# Altium footprint library Design III PCB Library.PcbLib: 98 footprints (part 4 of 7)
Each footprint in its own frame and in the unit in brackets; x right, y up, seen from the top. Pads: shape width x height; smd on the part's side, far side on the other; paste and mask are expansions set on the pad; w line width, h text height; cw(c..) or ccw(c..) is an arc to the next point about the centre after c.
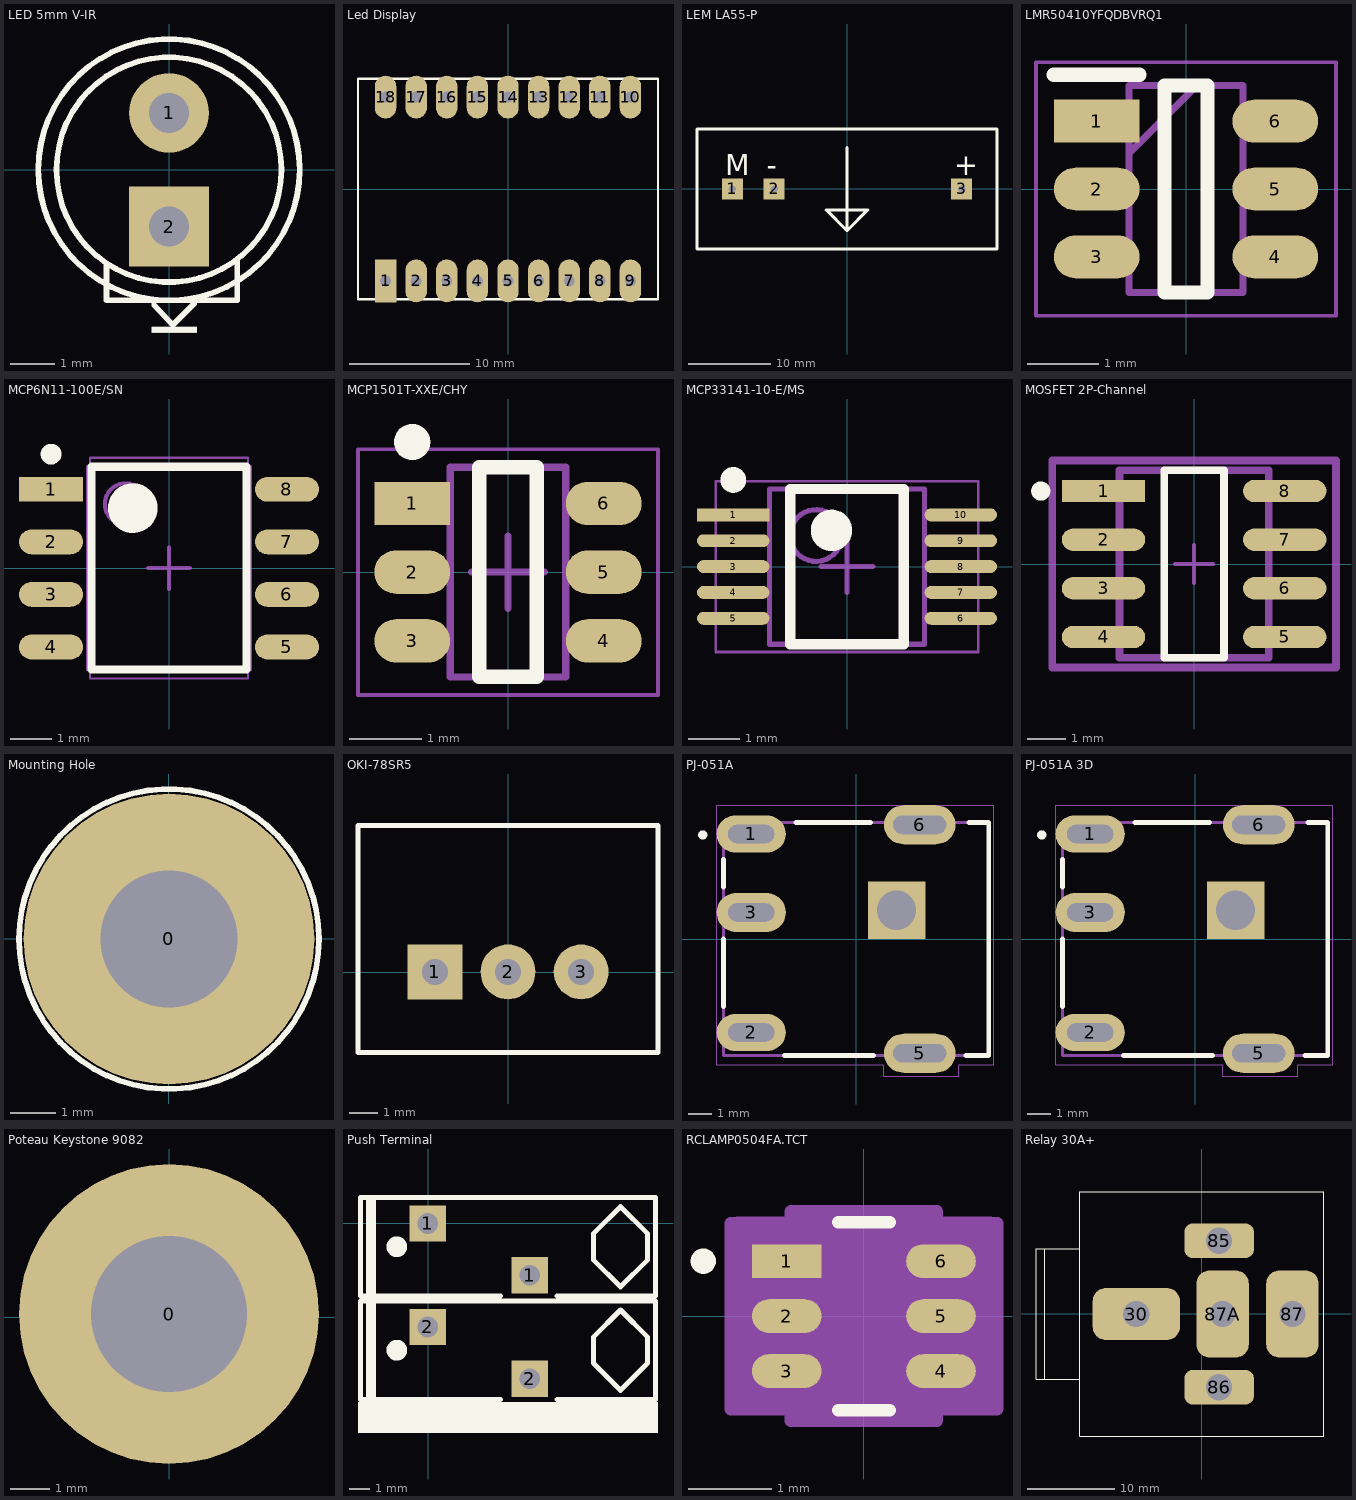
[diagram p3: the footprints below, top view; thin cyan lines are the x and y axes]

## LED 5mm V-IR [mil] "LED 5mm V-IR"
pads (2):
  round 70 hole 35.4: 1(-0.3,49.97)
  rect 70x70 hole 35.4: 2(-0.3,-50.03)
Top Overlay:
  circle w5: c-0.3,-0.03 r99
  circle w5: c-0.3,-0.03 r115
  lines w5: -55.3,-84.03 -55.3,-115.03 59.7,-115.03 59.7,-79.03
  text "K" at 24.7,-149.03 h40
3D body: height 20, standoff 10, extent -114.38,-114.79 114.71,114.76
3D body: height 20, standoff 10, extent -55.3,-115.03 59.7,-80.03
3D body: height 185, standoff 10, extent -104.47,-104.81 104.7,104.77
3D body: height 10, standoff -30, extent -15.18,35.01 14.7,64.95
3D body: height 10, standoff -30, extent -15.18,-64.99 14.7,-35.05
3D body: height 285, standoff 75, extent -104.2,-104.57 104.7,104.53

## Led Display [mil] "Led Display"
pads (18):
  rect 70x140 hole 35.4: 1(-400,-300)
  oval 70x140 hole 35.4: 2(-300,-300) 3(-200,-300) 4(-100,-300) 5(0,-300) 6(100,-300) 7(200,-300) 8(300,-300) 9(400,-300) 10(400,300) 11(300,300) 12(200,300) 13(100,300) 14(0,300) 15(-100,300) 16(-200,300) 17(-300,300) 18(-400,300)
Top Overlay:
  lines w7: -490,-360 -490,360 490,360 490,-360 -490,-360
3D body: height 45, standoff -25, extent 384.04,284.01 416,316
3D body: height 45, standoff -25, extent 384.04,-315.99 416.01,-284
3D body: height 45, standoff -25, extent -415.96,284.01 -384,315.99
3D body: height 45, standoff -25, extent -315.96,284.01 -284,316
3D body: height 45, standoff -25, extent -215.96,284.01 -184,316
3D body: height 45, standoff -25, extent -115.96,284.01 -84,316
3D body: height 45, standoff -25, extent -15.96,284.01 16,316
3D body: height 45, standoff -25, extent 84.04,284.02 116,316
3D body: height 45, standoff -25, extent 184.04,284.02 216,316
3D body: height 45, standoff -25, extent 284.04,284.02 316,316
3D body: height 45, standoff -25, extent 284.04,-315.98 316,-284
3D body: height 45, standoff -25, extent 184.04,-315.98 216,-284
3D body: height 45, standoff -25, extent 84.04,-315.98 116,-284
3D body: height 45, standoff -25, extent -15.96,-315.98 16,-284
3D body: height 45, standoff -25, extent -115.96,-315.98 -84,-284
3D body: height 45, standoff -25, extent -215.96,-315.98 -183.99,-284
3D body: height 45, standoff -25, extent -315.96,-315.98 -283.99,-284
3D body: height 45, standoff -25, extent -415.96,-315.99 -384,-284
3D body: height 318, standoff 315, extent 400.04,-259.98 460.01,-200
3D body: height 318, standoff 315, extent -79.96,-259.99 -20,-200.01
3D body: height 318, standoff 315, extent 139.5,-27 344.5,23
3D body: height 318, standoff 315, extent 55.82,-260.43 136.65,-3
3D body: height 318, standoff 315, extent 169,209 369,259
3D body: height 318, standoff 315, extent 114,-261 314,-211
3D body: height 318, standoff 315, extent 79.99,1 169.31,258.08
3D body: height 318, standoff 315, extent 313.69,-262.08 403.01,-5
3D body: height 318, standoff 315, extent 348.44,2.29 429.27,259.72
3D body: height 318, standoff 315, extent -130.56,3.29 -49.73,260.72
3D body: height 318, standoff 315, extent -165.31,-261.08 -75.99,-4
3D body: height 318, standoff 315, extent -399.01,2 -309.69,259.08
3D body: height 318, standoff 315, extent -365,-260 -165,-210
3D body: height 318, standoff 315, extent -310,210 -110,260
3D body: height 318, standoff 315, extent -340,-25 -135,25
3D body: height 51, standoff 45, extent -485,-355 485,355
3D body: height 315, standoff 50, extent -490,-360 490,360
3D body: height 50, standoff 0, extent 430,300 490,360
3D body: height 50, standoff 0, extent 430,-360 490,-300
3D body: height 50, standoff 0, extent -490,-360 -430,-300
3D body: height 50, standoff 0, extent -490,300 -430,360
3D body: height 317, standoff 315, extent -490,-360 490,360
3D body: height 318, standoff 315, extent -423.18,-259.43 -342.35,-2
3D body: height 45, standoff 42, extent 75,70 130,144.98
3D body: height 45, standoff 42, extent 15,70 65,140
3D body: height 45, standoff 42, extent -45,70 5,140
3D body: height 45, standoff 42, extent -85,70 -55,140
3D body: height 45, standoff 42, extent -155,70 -105,140

## LEM LA55-P [mm] "LEM LA55-P"
pads (3):
  rect 2.54x2.54 hole 0.899: 1(-13.998,-0.028) 2(-8.918,-0.028) 3(13.942,-0.028)
Top Overlay:
  lines w0.381: -0.028,5.052 -0.028,-5.108 ; -0.028,-5.108 2.512,-2.568 -2.568,-2.568 -0.028,-5.108 ; -18.316,-7.343 18.26,-7.343 18.26,7.288 -18.316,7.288 -18.316,-7.343
  text "M" at -14.887,1.623 h2.54
  text "-" at -9.807,1.623 h2.54
  text "+" at 13.053,1.623 h2.54
3D body: height 25.63, standoff 0.03, extent -18.315,-7.063 18.261,7.288

## LMR50410YFQDBVRQ1 [mm] "Buck Switching Regulator IC Positive Adjustable 1V 1 Output 1A SOT-23-6"
pads (6):
  rect 1.2x0.6 smd: 1(-1.25,0.95)
  oval 1.2x0.6 smd: 2(-1.25,0) 3(-1.25,-0.95) 4(1.25,-0.95) 5(1.25,0) 6(1.25,0.95)
Top Overlay:
  lines w0.2: -1.85,1.6 -0.65,1.6 ; -0.3,-1.45 0.3,-1.45 0.3,1.45 -0.3,1.45 -0.3,-1.45
Mechanical 13:
  lines w0.1: -0.8,0.5 0.15,1.45 ; -0.8,-1.45 0.8,-1.45 0.8,1.45 -0.8,1.45 -0.8,-1.45
Mechanical 15:
  lines w0.05: -2.1,-1.775 2.1,-1.775 2.1,1.775 -2.1,1.775 -2.1,-1.775
3D body "LMR50410YFQDBVRQ1.stp": height 1.45, standoff 0, extent -1.4,-1.45 1.4,1.45

## MCP6N11-100E/SN [mm] "Instrumentation Amplifier 1 Circuit Rail-to-Rail 8-SOIC"
pads (8):
  rect 1.55x0.6 smd: 1(-2.85,1.905)
  oval 1.55x0.6 smd: 2(-2.85,0.635) 3(-2.85,-0.635) 4(-2.85,-1.905) 5(2.85,-1.905) 6(2.85,-0.635) 7(2.85,0.635) 8(2.85,1.905)
Top Overlay:
  circle w0.6: c-0.875,1.45 r0.3
  circle w0.25: c-2.85,2.755 r0.125
  lines w0.2: -1.875,-2.45 1.875,-2.45 1.875,2.45 -1.875,2.45 -1.875,-2.45
Mechanical 13:
  circle w0.1: c-1.05,1.55 r0.5
  lines w0.1: -1.95,-2.45 1.95,-2.45 1.95,2.45 -1.95,2.45 -1.95,-2.45
Mechanical 15:
  lines w0.05: -1.905,-2.667 1.905,-2.667 1.905,2.667 -1.905,2.667 -1.905,-2.667
  lines w0.1: -0.5,0 0.5,0 ; 0,-0.5 0,0.5
3D body "SOIC127P600X175-8N.step": height 1.75, standoff 0, extent -3,-2.45 3,2.45

## MCP1501T-XXE/CHY [mm] "Series Voltage Reference IC Fixed V ±0.1% 20 mA SOT-23-6"
pads (6):
  rect 1.05x0.6 smd: 1(-1.325,0.95)
  oval 1.05x0.6 smd: 2(-1.325,0) 3(-1.325,-0.95) 4(1.325,-0.95) 5(1.325,0) 6(1.325,0.95)
Top Overlay:
  circle w0.25: c-1.325,1.8 r0.125
  lines w0.2: -0.4,-1.45 0.4,-1.45 0.4,1.45 -0.4,1.45 -0.4,-1.45
Mechanical 13:
  lines w0.1: -0.8,-1.45 -0.8,1.45 0.8,1.45 0.8,-1.45 -0.8,-1.45
Mechanical 15:
  lines w0.05: -2.075,-1.7 -2.075,1.7 2.075,1.7 2.075,-1.7 -2.075,-1.7
  lines w0.1: -0.5,0 0.5,0 ; 0,-0.5 0,0.5
3D body "SOT95P280X118-6N.step": height 1.17, standoff 0, extent -1.4,-1.45 1.4,1.45

## MCP33141-10-E/MS [mm] "12 Bit Analog to Digital Converter 1 Input 1 SAR 10-MSOP"
pads (10):
  rect 1.4x0.25 smd: 1(-2.2,1)
  oval 1.4x0.25 smd: 2(-2.2,0.5) 3(-2.2,0) 4(-2.2,-0.5) 5(-2.2,-1) 6(2.2,-1) 7(2.2,-0.5) 8(2.2,0) 9(2.2,0.5) 10(2.2,1)
Top Overlay:
  circle w0.25: c-2.2,1.675 r0.125
  circle w0.4: c-0.3,0.7 r0.2
  lines w0.2: -1.1,-1.5 -1.1,1.5 1.1,1.5 1.1,-1.5 -1.1,-1.5
Mechanical 13:
  circle w0.1: c-0.6,0.6 r0.5
  lines w0.1: -1.5,-1.5 -1.5,1.5 1.5,1.5 1.5,-1.5 -1.5,-1.5
Mechanical 15:
  lines w0.05: -2.54,-1.651 -2.54,1.651 2.54,1.651 2.54,-1.651 -2.54,-1.651
  lines w0.1: -0.5,0 0.5,0 ; 0,-0.5 0,0.5
3D body "TSSOP50P490X110-10M.step": height 1.1, standoff 0, extent -2.45,-1.5 2.45,1.5

## MOSFET 2P-Channel [mm]
pads (8):
  rect 2.174x0.583 smd paste+0 mask+0: 1(-2.366,1.905)
  rrect100% 2.174x0.583 smd paste+0 mask+0: 2(-2.366,0.635) 3(-2.366,-0.635) 4(-2.366,-1.905) 5(2.366,-1.905) 6(2.366,-0.635) 7(2.366,0.635) 8(2.366,1.905)
Top Overlay:
  circle w0.25: c-4.003,1.905 r0.125
  lines w0.2: -0.779,-2.45 0.779,-2.45 0.779,2.45 -0.779,2.45 -0.779,-2.45
Top Assembly:
  lines w0.2: -3.703,-2.7 3.703,-2.7 3.703,2.7 -3.703,2.7 -3.703,-2.7
Top Courtyard:
  lines w0.2: -3.703,-2.7 3.703,-2.7 3.703,2.7 -3.703,2.7 -3.703,-2.7
Board:
  lines w0.2: -1.95,-2.45 1.95,-2.45 1.95,2.45 -1.95,2.45 -1.95,-2.45
Top Component Center:
  lines w0.1: -0.5,0 0.5,0 ; 0,-0.5 0,0.5
3D body "Trans_Infineon_IRF9310TRPBF_eec.STEP": height 0.25, standoff 0, extent -3.703,-2.7 3.703,2.7

## Mounting Hole [mm] "Mounting Hole"
pads (1):
  round 6.35 hole 3: 0(0,0)
Top Overlay:
  circle w0.127: c0,0 r3.277

## OKI-78SR5 [mm] "OKI-78SR5"
pads (3):
  rect 1.905x1.905 hole 0.899: 1(-2.54,0.012)
  round 1.905 hole 0.899: 2(0,0.012) 3(2.54,0.012)
Top Overlay:
  lines w0.178: -5.207,-2.782 5.207,-2.782 ; -5.207,-2.782 -5.207,5.092 5.207,5.092 5.207,-2.782 ; -5.207,-2.782 5.207,-2.782
3D body: height 16.51, standoff 0, extent -5.207,1.028 5.207,2.552
3D body: height 12.7, standoff 5.08, extent -4.445,-2.782 4.445,1.028
3D body: height 10.16, standoff 5.08, extent -4.699,2.552 -2.794,5.092
3D body: height 13.97, standoff 7.62, extent -2.635,2.552 4.731,4.076
3D body: height 6.35, standoff 2.54, extent -1.968,2.552 0,4.203
3D body: height 5.71, standoff 4.44, extent 1.016,2.552 3.493,3.822
3D body: height 3.81, standoff 2.54, extent 1.048,2.552 3.524,3.822

## PJ-051A [mm] "DC Power Barrel Jack"
pads (6):
  oval 3x1.6 hole 0.8 slot 2 at 0 deg: 1(-4.55,4.55) 2(-4.55,-4.05)
  oval 3x1.7 hole 0.8 slot 2 at 0 deg: 3(-4.55,1.15)
  oval 3.1x1.7 hole 0.8 slot 2.3 at 0 deg: 5(2.75,-4.95) 6(2.75,4.95)
  rect 2.5x2.5 hole 1.7: ""(1.75,1.25)
Top Overlay:
  circle w0.2: c-6.65,4.51 r0.1
  lines w0.2: -5.75,-2.925 -5.75,0 ; -5.75,2.25 -5.75,3.45 ; -3.125,-5.05 0.75,-5.05 ; -2.625,5.05 0.625,5.05 ; 4.75,-5.05 5.75,-5.05 5.75,5.05 4.875,5.05
Top Assembly:
  lines w0: 0.85,0.35 0.85,2.15 2.65,2.15 2.65,0.35 0.85,0.35
Mechanical 13:
  lines w0.127: -5.75,-5.05 5.75,-5.05 5.75,5.05 -5.75,5.05 -5.75,-5.05
Mechanical 15:
  lines w0.05: -6.05,-5.45 -6.05,5.8 5.95,5.8 5.95,-5.45 4.45,-5.45 4.45,-5.95 1.2,-5.95 1.2,-5.45 -6.05,-5.45

## PJ-051A 3D [mm] "DC Power Barrel Jack"
pads (6):
  oval 3x1.6 hole 0.8 slot 2 at 0 deg: 1(-4.55,4.55) 2(-4.55,-4.05)
  oval 3x1.7 hole 0.8 slot 2 at 0 deg: 3(-4.55,1.15)
  oval 3.1x1.7 hole 0.8 slot 2.3 at 0 deg: 5(2.75,-4.95) 6(2.75,4.95)
  rect 2.5x2.5 hole 1.7: ""(1.75,1.25)
Top Overlay:
  circle w0.2: c-6.65,4.51 r0.1
  lines w0.2: -5.75,-2.925 -5.75,0 ; -5.75,2.25 -5.75,3.45 ; -3.125,-5.05 0.75,-5.05 ; -2.625,5.05 0.625,5.05 ; 4.75,-5.05 5.75,-5.05 5.75,5.05 4.875,5.05
Top Assembly:
  lines w0: 0.85,0.35 0.85,2.15 2.65,2.15 2.65,0.35 0.85,0.35
Mechanical 13:
  lines w0.127: -5.75,-5.05 5.75,-5.05 5.75,5.05 -5.75,5.05 -5.75,-5.05
Mechanical 15:
  lines w0.05: -6.05,-5.45 -6.05,5.8 5.95,5.8 5.95,-5.45 4.45,-5.45 4.45,-5.95 1.2,-5.95 1.2,-5.45 -6.05,-5.45
3D body "CUI_DEVICES_PJ-051A.step": height 7.3, standoff -2.5, extent -6,-5.05 5.75,5.05

## Poteau Keystone 9082 [mil] "Poteau Keystone 9082"
pads (1):
  round 300 hole 156: 0(0,3.09)
3D body: height 306.17, standoff -0.69, extent 10.67,-29.84 127.5,36.03
3D body: height 322, standoff 0, extent -77.38,-74.75 78.01,80.94
3D body: height 400, standoff 244, extent -77.18,-74.57 78,80.77
3D body: height 350, standoff 266, extent -350,-346.91 350,353.09
3D body: height 266, standoff 100, extent -37.5,-134.4 37.5,140.6
3D body: height 266, standoff 100, extent -137.5,-34.41 137.5,40.59
3D body: height 375, standoff 350, extent -350,-346.91 350,353.09
3D body: height 100, standoff 0, extent -138.89,-136.63 140,142.82

## Push Terminal [mil]
pads (4):
  rect 70x70 hole 40: 1(-1.14,-0.65) 1(195.86,-100.65) 2(195.86,-300.65)
  rect 70x70 hole 40 paste+0: 2(-1.14,-200.65)
Top Overlay:
  circle w20: c-61.14,-45.65 r10
  circle w20: c-61.14,-245.65 r10
  rectangle: -136.14,-405.65 443.86,-345.65
  rectangle: -121.14,-145.65 -101.14,54.35
  rectangle: -121.14,-345.65 -101.14,-145.65
  lines w10: 138.86,-340.65 -131.14,-340.65 -131.14,-150.65 438.86,-150.65 438.86,-340.65 248.86,-340.65 ; 138.86,-140.65 -131.14,-140.65 -131.14,49.35 438.86,49.35 438.86,-140.65 248.86,-140.65 ; 318.86,-270.65 371.36,-323.15 423.86,-270.65 423.86,-245.65 423.86,-220.65 371.36,-168.15 318.86,-220.65 318.86,-245.65 318.86,-270.65 ; 318.86,-70.65 318.86,-20.65 371.36,31.85 423.86,-20.65 423.86,-45.65 423.86,-70.65 371.36,-123.15 318.86,-70.65

## RCLAMP0504FA.TCT [mil]
pads (6):
  rect 33x16 smd paste+0 mask+0: 1(-36.5,26)
  oval 33x16 smd paste+0 mask+0: 2(-36.5,0) 3(-36.5,-26) 4(36.5,-26) 5(36.5,0) 6(36.5,26)
Top Overlay:
  circle w6: c-76,26 r3
  lines w6: -12.17,-44.5 12.17,-44.5 ; -12.17,44.5 12.17,44.5
Mechanical 5:
  region: 60.5,-47 -60.5,-47 -60.5,47 60.5,47
Mechanical 13:
  circle w0: c-14.5,26 r1.5
  lines w0: -12,39.5 ccw(c0,39.5) 12,39.5
  lines w1: -24.5,-39.5 24.5,-39.5 24.5,39.5 -24.5,39.5 -24.5,-39.5
Mechanical 15:
  region: -34.5,-44 -63,-44 -63,44 -34.5,44 -34.5,49.5 34.5,49.5 34.5,44 63,44 63,-44 34.5,-44 34.5,-49.5 -34.5,-49.5
  lines w6: -63,-44 -63,44 -34.5,44 -34.5,49.5 34.5,49.5 34.5,44 63,44 63,-44 34.5,-44 34.5,-49.5 -34.5,-49.5 -34.5,-44 -63,-44
3D body "RCLAMP0504FA_SEM.step": height 43.11, standoff 0, extent -39.21,-39.49 39.21,39.49

## Relay 30A+ [mm] "Relay Auto"
pads (5):
  rrect50% 10x6 hole 3: 30(-7.512,-0.002)
  rrect50% 8x4 hole 3: 85(1.988,8.398) 86(1.988,-8.402)
  rrect50% 6x10 hole 3: 87(10.388,-0.002) 87A(2.388,-0.002)
Top Overlay:
  lines w0.025: -18.012,-7.527 -18.012,7.473 ; -14.012,-7.502 -19.012,-7.502 -19.012,7.498 -14.012,7.498 ; -10.662,-0.002 -4.362,-0.002 ; -7.512,-0.102 -7.512,0.098 ; -1.187,8.398 5.113,8.398 ; -1.162,-8.402 5.138,-8.402 ; -0.112,-0.002 0.138,-0.002 ; 0.013,-0.127 0.013,0.123 ; 1.988,-8.502 1.988,-8.302 ; 1.988,8.298 1.988,8.498 ; 2.288,-0.002 2.488,-0.002 ; 2.388,-3.152 2.388,3.148 ; 10.288,-0.002 10.488,-0.002 ; 10.388,-3.152 10.388,3.148 ; -14.012,-14.002 -14.012,13.998 13.988,13.998 13.988,-14.002 -14.012,-14.002
3D body: height 0, standoff -3, extent 0.9,-1.499 3.888,1.495
3D body: height 0, standoff -3, extent 0.5,-9.899 3.488,-6.905
3D body: height 0, standoff -3, extent 8.9,-1.499 11.888,1.495
3D body: height 0, standoff -3, extent 0.5,6.901 3.488,9.895
3D body: height 2, standoff 0, extent -14.012,-14.002 -3.012,-3.802
3D body: height 2, standoff 0, extent -14.012,3.798 -3.012,13.998
3D body: height 2, standoff 0, extent -14.012,3.798 -3.012,3.798
3D body: height 23, standoff 0, extent -14.012,-14.002 14.013,13.998
3D body: height 23, standoff 12, extent -10.662,-0.152 -4.362,0.148
3D body: height 48, standoff 44, extent -15.012,-7.502 -14.012,7.498
3D body: height 48, standoff 47, extent -19.012,-7.502 -14.012,7.498
3D body: height 64, standoff 48, extent -19.012,-7.502 -18.012,7.498
3D body: height 44, standoff 27, extent -18.012,-7.502 -14.012,7.498
3D body: height 48, standoff 23, extent -14.019,-13.986 13.981,14.014
3D body: height 23, standoff 12, extent -1.162,8.248 5.138,8.548
3D body: height 23, standoff 12, extent -1.162,-8.552 5.138,-8.252
3D body: height 23, standoff 12, extent 10.238,-3.152 10.538,3.148
3D body: height 23, standoff 12, extent 2.238,-3.152 2.538,3.148
3D body: height 0, standoff -3, extent -8.975,-1.499 -5.987,1.495